# Altium footprint library LimeMicroAltiumLib_pcbLib_r01.PcbLib: 434 footprints (part 21 of 29)
Each footprint in its own frame and in the unit in brackets; x right, y up, seen from the top. Pads: shape width x height; smd on the part's side, far side on the other; paste and mask are expansions set on the pad; w line width, h text height; cw(c..) or ccw(c..) is an arc to the next point about the centre after c.
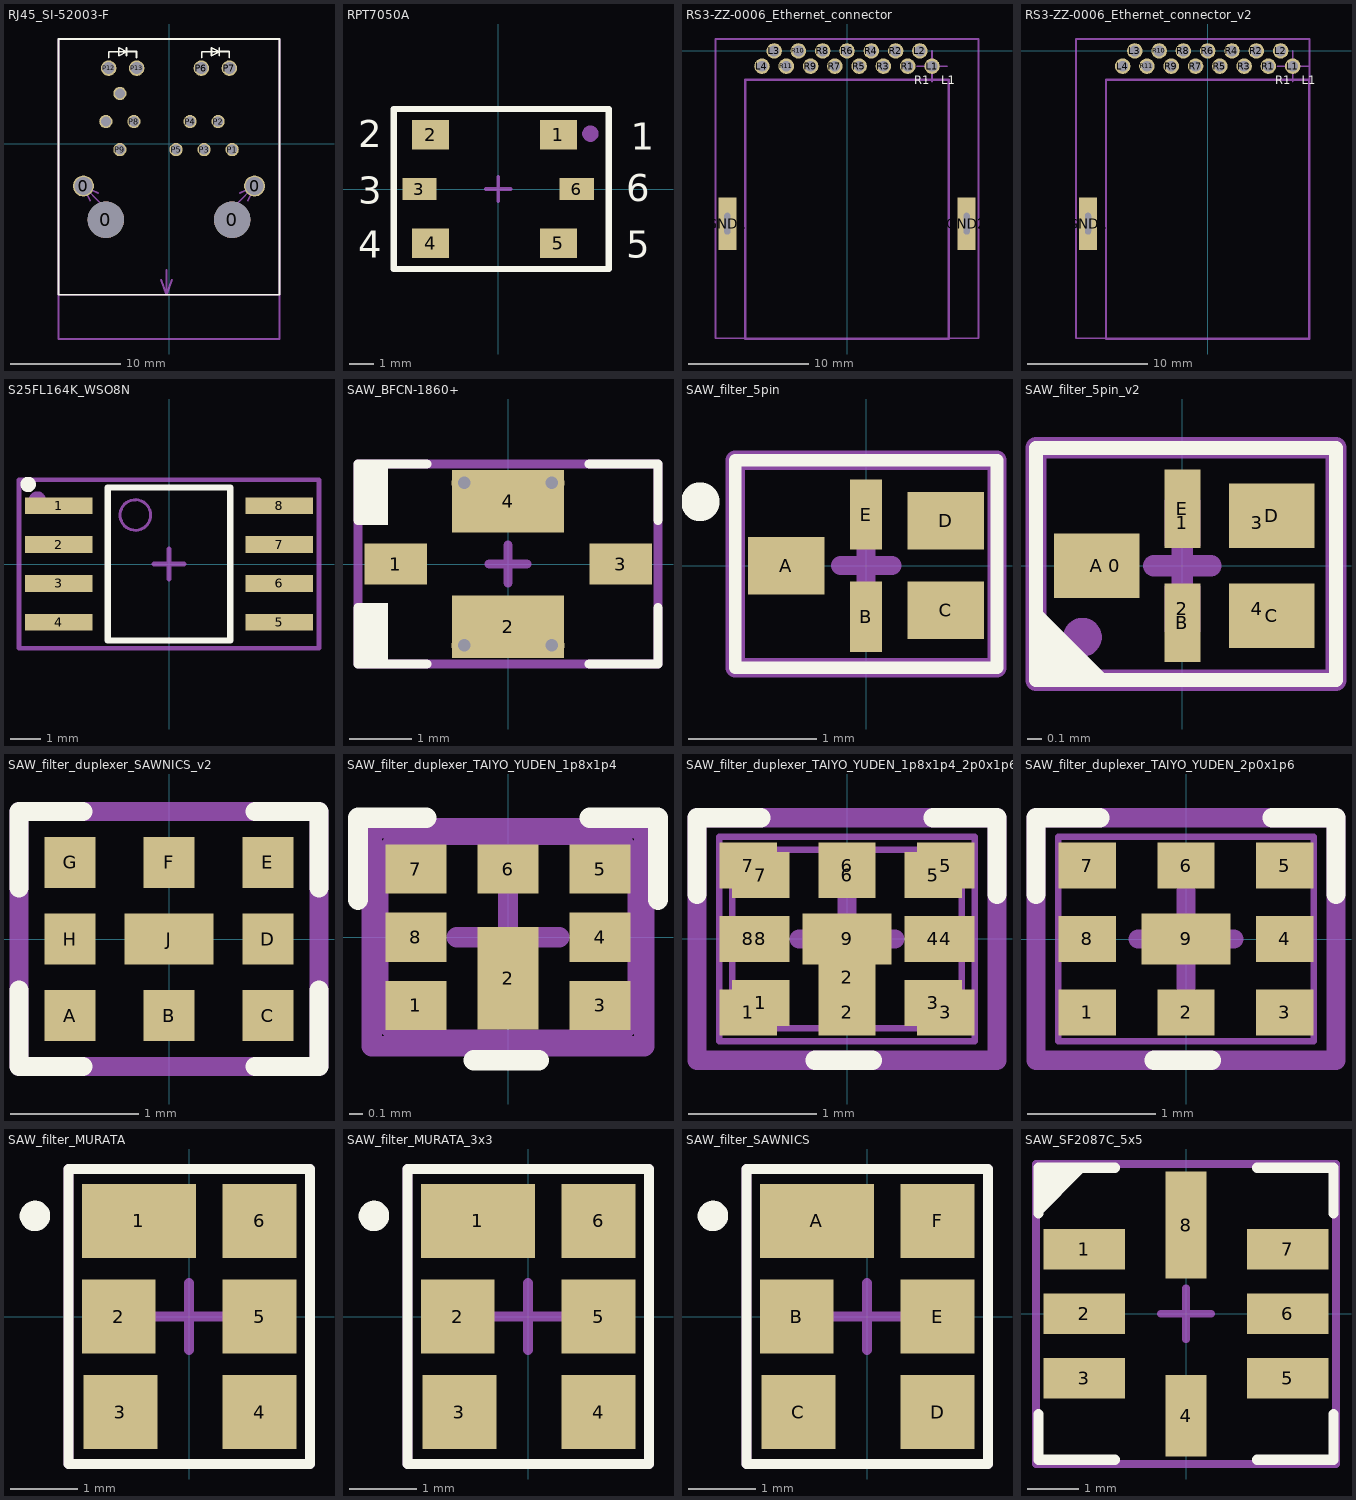
[diagram p20: the footprints below, top view; thin cyan lines are the x and y axes]

## RJ45_SI-52003-F [mm]
pads (17):
  round 1.9 hole 1.6 mask+0.05: 0(-7.745,-3.81) 0(7.745,-3.81)
  round 3.3 hole 3.3 unplated mask+0.05: 0(-5.715,-6.86) 0(5.715,-6.86)
  round 1.2 hole 0.9 mask+0.05: P1(5.715,-0.51) P2(4.445,2.03) P3(3.175,-0.51) P4(1.905,2.03) P5(0.635,-0.51) P8(-3.175,2.03) P9(-4.445,-0.51) P10(-5.715,2.03) P11(-4.445,4.57)
  round 1.4 hole 1.1 mask+0.05: P6(2.925,6.86) P7(5.465,6.86) P12(-5.465,6.86) P13(-2.925,6.86)
Top Overlay:
  lines w0.15: -5.44,7.815 -5.44,8.34 -3.84,8.34 ; -3.84,7.99 -3.84,8.69 ; -3.84,8.365 -2.94,8.365 -2.94,7.815 ; 2.95,7.815 2.95,8.34 4.55,8.34 ; 4.55,7.99 4.55,8.69 ; 4.55,8.365 5.45,8.365 5.45,7.815 ; -3.84,8.34 -4.54,8.69 -4.54,7.99 -3.84,8.34 ; 4.55,8.34 3.85,7.99 3.85,8.69 4.55,8.34 ; -10,-13.66 -10,9.5 10,9.5 10,-13.66 -10,-13.66
Mechanical 15:
  lines w0.15: -10,-13.66 10,-13.66 ; -7.119,-5.143 -7.745,-3.81 ; -6.412,-4.436 -7.745,-3.81 ; -6.147,-5.408 -7.745,-3.81 ; -0.725,-12.275 -0.225,-13.66 ; -0.225,-11.4 -0.225,-13.66 ; 0.275,-12.275 -0.225,-13.66 ; 6.147,-5.408 7.745,-3.81 ; 6.412,-4.436 7.745,-3.81 ; 7.119,-5.143 7.745,-3.81 ; -10,-17.65 10,-17.65 10,9.5 -10,9.5 -10,-17.65
  text "Assembly Note: solder plated holes" at -8.9,-6.45 h0.55
  text ".Designator" at -0.05,-0.025 h0.55
  text "6 / (A)" at 2.225,5.925 h0.55
  text "7 / (C)" at 4.85,5.95 h0.55
  text "13 / (C)" at -3.625,5.95 h0.55
  text "12 / (A)" at -6.15,5.95 h0.55
  text "11" at -4.725,4.25 h0.55
  text "10" at -6.025,1.75 h0.55
  text "9" at -4.6,-0.8 h0.55
  text "8" at -3.3,1.75 h0.55
  text "5" at 0.525,-0.725 h0.55
  text "4" at 1.875,1.825 h0.55
  text "3" at 3.075,-0.775 h0.55
  text "2" at 4.375,1.75 h0.55
  text "1" at 5.625,-0.7 h0.55
  text "board edge" at -2.7,-11.05 h0.55
3D body: height 0, standoff -2.5, extent 6.951,-4.608 8.545,-3.011
3D body: height 0, standoff -2.5, extent -8.539,-4.608 -6.945,-3.011
3D body: height 0, standoff -2.5, extent 4.115,-8.457 7.315,-5.263
3D body: height 0, standoff -2.5, extent -7.315,-8.457 -4.115,-5.263
3D body: height 0, standoff -2.5, extent 5.318,-0.909 6.115,-0.111
3D body: height 0, standoff -2.5, extent 2.778,-0.909 3.575,-0.111
3D body: height 0, standoff -2.5, extent 0.238,-0.909 1.035,-0.111
3D body: height 0, standoff -2.5, extent -4.842,-0.909 -4.045,-0.111
3D body: height 0, standoff -2.5, extent -6.112,1.631 -5.315,2.429
3D body: height 0, standoff -2.5, extent -3.572,1.631 -2.775,2.429
3D body: height 0, standoff -2.5, extent 4.048,1.631 4.845,2.429
3D body: height 0, standoff -2.5, extent 1.508,1.631 2.305,2.429
3D body: height 0, standoff -2.5, extent -4.842,4.171 -4.045,4.969
3D body: height 0, standoff -2.5, extent 4.969,6.361 5.965,7.359
3D body: height 0, standoff -2.5, extent 2.429,6.361 3.425,7.359
3D body: height 0, standoff -2.5, extent -3.421,6.361 -2.425,7.359
3D body: height 0, standoff -2.5, extent -5.961,6.361 -4.965,7.359
3D body "ACC-M-RJE60-188-5X01-REVT1_v2.STEP": height 14.73, standoff -0.04, extent -9.105,-17.62 9.105,3.87
3D body: height 13.6, standoff 0, extent -8,3.025 8,7.7

## RPT7050A [mm] "Rakon's Pluto+ ASIC"
pads (6):
  rect 1.5x1.2 smd: 1(2.45,2.2) 2(-2.75,2.2) 4(-2.75,-2.2) 5(2.45,-2.2)
  rect 1.4x0.9 smd: 3(-3.2,0) 6(3.2,0)
Top Overlay:
  lines w0.254: -4.25,-3.25 4.5,-3.25 4.5,3.25 -4.25,3.25 -4.25,3 -4.25,-3.25
  text "1" at 5.4,1.6 h1.1
  text "5" at 5.2,-2.8 h1.1
  text "6" at 5.2,-0.5 h1.1
  text "4" at -5.7,-2.8 h1.1
  text "3" at -5.7,-0.6 h1.1
  text "2" at -5.7,1.7 h1.1
Mechanical 15:
  circle w0.35: c3.75,2.25 r0.158
  lines w0.15: -0.5,0 0.5,0 ; 0,-0.5 0,0.5 ; -4.25,-3.25 -4.25,3.25 4.5,3.25 4.5,-3.25 -4.25,-3.25
  text ".Designator" at 0,0 h0.55

## RS3-ZZ-0006_Ethernet_connector [mm]
pads (17):
  rect 1.5x4.4 hole 0.5 slot 1.8 at 90 deg mask+0.05: GND1(-10,-14.43) GND2(10,-14.43)
  round 1.3 hole 0.9 mask+0.05: L1(7.105,-1.27) L2(6.09,0) L3(-6.09,0) L4(-7.105,-1.27) R1(5.075,-1.27) R2(4.06,0) R3(3.045,-1.27) R4(2.03,0) R5(1.015,-1.27) R6(0,0) R7(-1.015,-1.27) R8(-2.03,0) R9(-3.045,-1.27) R10(-4.06,0) R11(-5.075,-1.27)
Top Overlay:
  text "R1" at 5.625,-2.775 h0.7
  text "L1" at 7.875,-2.775 h0.7
Mechanical 13:
  lines w0.2: -8.5,-24.07 -8.5,-2.4 8.5,-2.4 8.5,-24.07 -8.5,-24.07
Mechanical 15:
  lines w0.15: 5.835,-1.27 7.105,-1.27 ; 7.105,-2.54 7.105,-1.27 ; 7.105,0 7.105,-1.27 ; 8.375,-1.27 7.105,-1.27 ; -11,-24 11,-24 11,1 -11,1 -11,-24
  text "L1" at 7.875,-2.775 h0.7
  text "R1" at 4.5,-3 h0.7
  text "L4" at -9.5,-2.5 h0.7
  text "L3" at -8.5,0 h0.7
  text "L2" at 7.5,0 h0.7
  text ".Designator" at 0,-12.5 h0.7

## RS3-ZZ-0006_Ethernet_connector_v2 [mm]
pads (16):
  rect 1.5x4.4 hole 0.5 slot 1.8 at 90 deg mask+0.05: GND1(-10,-14.43)
  round 1.3 hole 0.9 mask+0.05: L1(7.105,-1.27) L2(6.09,0) L3(-6.09,0) L4(-7.105,-1.27) R1(5.075,-1.27) R2(4.06,0) R3(3.045,-1.27) R4(2.03,0) R5(1.015,-1.27) R6(0,0) R7(-1.015,-1.27) R8(-2.03,0) R9(-3.045,-1.27) R10(-4.06,0) R11(-5.075,-1.27)
Top Overlay:
  text "R1" at 5.625,-2.775 h0.7
  text "L1" at 7.875,-2.775 h0.7
Mechanical 13:
  lines w0.2: -8.5,-24.07 -8.5,-2.4 8.5,-2.4 8.5,-24.07 -8.5,-24.07
Mechanical 15:
  lines w0.15: 5.835,-1.27 7.105,-1.27 ; 7.105,-2.54 7.105,-1.27 ; 7.105,0 7.105,-1.27 ; 8.375,-1.27 7.105,-1.27 ; -11,-24 8.5,-24 8.5,1 -11,1 -11,-24
  text "L1" at 7.875,-2.775 h0.7
  text "R1" at 4.5,-3 h0.7
  text "L4" at -9.5,-2.5 h0.7
  text "L3" at -8.5,0 h0.7
  text "L2" at 7.5,0 h0.7
  text ".Designator" at 0,-12.5 h0.7

## S25FL164K_WSO8N [mm]
height 1.7
pads (8):
  rect 2.2x0.55 smd: 1(-3.6,1.905) 2(-3.6,0.635) 3(-3.6,-0.635) 4(-3.6,-1.905) 5(3.6,-1.905) 6(3.6,-0.635) 7(3.6,0.635) 8(3.6,1.905)
Top Overlay:
  circle w0.25: c-4.6,2.6 r0.125
  lines w0.2: -2,-2.5 2,-2.5 2,2.5 -2,2.5 -2,-2.5
Mechanical 13:
  circle w0.1: c-1.1,1.6 r0.5
  lines w0.1: -2,-2.5 2,-2.5 2,2.5 -2,2.5 -2,-2.5
Mechanical 15:
  circle w0.35: c-4.3,2.1 r0.1
  lines w0.15: -0.5,0 0.5,0 ; 0,-0.5 0,0.5 ; -4.9,-2.75 4.9,-2.75 4.9,2.75 -4.9,2.75 -4.9,-2.75
  text ".Designator" at 0,0 h0.55
3D body "User Library-SOIC8_Wide_5mmx5mm.step": height 1.75, standoff -0.01, extent -4.151,-2.73 3.95,2.73

## SAW_BFCN-1860+ [mm]
pads (4):
  rect 1x0.65 smd mask+0.05: 1(-1.8,0) 3(1.8,0)
  rect 1.8x1 smd mask+0.05: 2(0,-1) 4(0,1)
via -0.7,-1.3 diameter 0.4 hole 0.2
via 0.7,-1.3 diameter 0.4 hole 0.2
via 0.7,1.3 diameter 0.4 hole 0.2
via -0.7,1.3 diameter 0.4 hole 0.2
Top Overlay:
  region: -2.4,-0.625 -1.925,-0.625 -1.925,-1.6 -2.4,-1.6
  region: -2.4,0.625 -1.925,0.625 -1.925,1.6 -2.4,1.6
  lines w0.15: -2.4,-0.7 -2.4,-1.6 -1.3,-1.6 ; -2.4,0.7 -2.4,1.6 -1.3,1.6 ; 1.3,-1.6 2.4,-1.6 2.4,-0.7 ; 1.3,1.6 2.4,1.6 2.4,0.7
Mechanical 15:
  circle w0.25: c-1.8,0 r0.1
  lines w0.15: -0.3,0 0.3,0 ; 0,-0.3 0,0.3 ; -2.4,-1.6 2.4,-1.6 2.4,1.6 -2.4,1.6 -2.4,-1.6
  text ".Designator" at 0,0 h0.55
3D body: height 1, standoff 0, extent -1.6,-0.8 1.6,0.8

## SAW_filter_5pin [mm]
pads (5):
  rect 0.6x0.45 smd mask+0.05: A(-0.625,0) C(0.625,-0.35) D(0.625,0.35)
  rect 0.25x0.55 smd mask+0.05: B(0,-0.4) E(0,0.4)
Top Overlay:
  circle w0.254: c-1.3,0.5 r0.025
  lines w0.1: -1.025,-0.8 -1.025,0.825 1.025,0.825 1.025,-0.8 -1.025,-0.8
Mechanical 15:
  lines w0.15: -0.2,0 0.2,0 ; 0,-0.2 0,0.2 ; -1.025,-0.8 1.025,-0.8 1.025,0.825 -1.025,0.825 -1.025,-0.8
  text ".Designator" at 0.075,0 h0.55
3D body: height 0.4, standoff 0, extent -0.7,-0.55 0.7,0.55

## SAW_filter_5pin_v2 [mm]
pads (10):
  rect 0.25x0.325 on Mech13 mask+0.05: 0(-0.475,0) 1(0,0.3) 2(0,-0.3) 3(0.525,0.3) 4(0.525,-0.3)
  rect 0.6x0.45 smd mask+0.05: A(-0.6,0) C(0.625,-0.35) D(0.625,0.35)
  rect 0.25x0.55 smd mask+0.05: B(0,-0.4) E(0,0.4)
Top Overlay:
  region: -1.025,-0.275 -0.5,-0.8 -1.025,-0.8
  lines w0.1: -1.025,-0.8 1.075,-0.8 1.075,0.825 -1.025,0.825 -1.025,-0.8
Mechanical 15:
  circle w0.2: c-0.7,-0.5 r0.035
  lines w0.15: -0.2,0 0.2,0 ; 0,-0.2 0,0.2 ; -1.025,-0.8 -1.025,0.825 1.075,0.825 1.075,-0.8 -1.025,-0.8
  text ".Designator" at 0.075,0 h0.55
3D body: height 0.4, standoff 0, extent -0.7,-0.55 0.7,0.55

## SAW_filter_duplexer_SAWNICS_v2 [mm]
pads (9):
  rect 0.4x0.4 smd mask+0.05: A(-0.775,-0.6) B(0,-0.6) C(0.775,-0.6) D(0.775,0) E(0.775,0.6) F(0,0.6) G(-0.775,0.6) H(-0.775,0)
  rect 0.7x0.4 smd mask+0.05: J(0,0)
Top Overlay:
  lines w0.15: -1.175,-0.4 -1.175,-1 -0.675,-1 ; -1.175,0.4 -1.175,1 -0.675,1 ; 0.675,-1 1.175,-1 1.175,-0.4 ; 0.675,1 1.175,1 1.175,0.4
Mechanical 15:
  circle w0.2: c-0.75,-0.575 r0.035
  lines w0.15: -1.175,-1 -1.175,1 1.175,1 1.175,-1 -1.175,-1
  text ".Designator" at -0.025,0 h0.55
3D body: height 0.5, standoff 0, extent -1.025,-0.8 0.975,0.8

## SAW_filter_duplexer_TAIYO_YUDEN_1p8x1p4 [mm] "Duplexer Taiyo Yuden 1.8 mm x 1.4 mm size (ex. band 3 D6DA1G842K2C4)"
pads (8):
  rect 0.45x0.36 smd mask+0.05: 1(-0.675,-0.5) 3(0.675,-0.5) 4(0.675,0) 5(0.675,0.5) 6(0,0.5) 7(-0.675,0.5) 8(-0.675,0)
  rect 0.45x0.75 smd mask+0.05: 2(0,-0.3)
Top Overlay:
  lines w0.15: -1.1,0.275 -1.1,0.875 -0.6,0.875 ; -0.25,-0.9 0.225,-0.9 ; 0.6,0.875 1.1,0.875 1.1,0.275
Top Solder:
  region: 0.95,-0.725 0.95,0.725 0.4,0.725 0.4,-0.725
  region: -0.95,-0.725 -0.95,0.725 -0.4,0.725 -0.4,-0.725
Mechanical 13:
  region: -0.775,-0.575 -0.775,-0.345 -0.475,-0.345 -0.475,-0.575
  region: -0.775,0.345 -0.775,0.575 -0.475,0.575 -0.475,0.345
  region: -0.775,-0.115 -0.775,0.115 -0.475,0.115 -0.475,-0.115
  region: -0.15,0.345 -0.15,0.575 0.15,0.575 0.15,0.345
  region: 0.775,-0.115 0.775,0.115 0.475,0.115 0.475,-0.115
  region: 0.775,0.345 0.775,0.575 0.475,0.575 0.475,0.345
  region: 0.775,-0.575 0.775,-0.345 0.475,-0.345 0.475,-0.575
  region: -0.15,-0.575 -0.15,-0.005 0.15,-0.005 0.15,-0.575
  lines w0.05: -0.9,-0.7 -0.9,0.7 0.9,0.7 0.9,-0.7 -0.9,-0.7
  text "1" at -0.425,-0.55 h0.2
  text "3" at 0.3,-0.55 h0.2
  text "5" at 0.3,0.375 h0.2
  text "7" at -0.425,0.37 h0.2
Mechanical 15:
  circle w0.2: c-0.65,-0.5 r0.035
  lines w0.15: -0.375,0 0,0 ; 0,-0.375 0,0 ; 0,0.375 0,0 ; 0.375,0 0,0 ; -1,-0.8 1,-0.8 1,0.8 -1,0.8 -1,-0.8
  text ".Designator" at 0.075,0.075 h0.55
3D body: height 0.5, standoff 0, extent -0.9,-0.7 0.9,0.7

## SAW_filter_duplexer_TAIYO_YUDEN_1p8x1p4_2p0x1p6 [mm] "Duplexer Taiyo Yuden unified 1.8 mm x 1.4 mm size and 2 mm x 1.6 mm packages"
pads (17):
  rect 0.45x0.36 smd mask+0.05: 1(-0.775,-0.575) 1(-0.675,-0.5) 2(0,-0.575) 3(0.675,-0.5) 3(0.775,-0.575) 4(0.675,0) 4(0.775,0) 5(0.675,0.5) 5(0.775,0.575) 6(0,0.5) 6(0,0.575) 7(-0.775,0.575) 7(-0.675,0.5) 8(-0.775,0) 8(-0.675,0)
  rect 0.45x0.75 smd mask+0.05: 2(0,-0.3)
  rect 0.7x0.4 smd mask+0.05: 9(0,0)
Top Overlay:
  lines w0.15: -1.175,0.35 -1.175,0.95 -0.675,0.95 ; -0.25,-0.95 0.2,-0.95 ; 0.675,0.95 1.175,0.95 1.175,0.35
Top Solder:
  region: -1.05,-0.825 -1.05,0.825 1.05,0.825 1.05,-0.825
Mechanical 13:
  region: -0.925,-0.725 -0.925,-0.425 -0.625,-0.425 -0.625,-0.725
  region: -0.15,-0.725 -0.15,-0.425 0.15,-0.425 0.15,-0.725
  region: -0.925,-0.15 -0.925,0.15 -0.625,0.15 -0.625,-0.15
  region: 0.625,-0.725 0.625,-0.425 0.925,-0.425 0.925,-0.725
  region: 0.625,0.725 0.625,0.425 0.925,0.425 0.925,0.725
  region: -0.15,0.725 -0.15,0.425 0.15,0.425 0.15,0.725
  region: -0.925,0.725 -0.925,0.425 -0.625,0.425 -0.625,0.725
  region: -0.3,-0.15 -0.3,0.15 0.3,0.15 0.3,-0.15
  region: 0.625,-0.15 0.625,0.15 0.925,0.15 0.925,-0.15
  region: -0.775,-0.575 -0.775,-0.345 -0.475,-0.345 -0.475,-0.575
  region: -0.775,0.345 -0.775,0.575 -0.475,0.575 -0.475,0.345
  region: -0.775,-0.115 -0.775,0.115 -0.475,0.115 -0.475,-0.115
  region: -0.15,0.345 -0.15,0.575 0.15,0.575 0.15,0.345
  region: 0.775,-0.115 0.775,0.115 0.475,0.115 0.475,-0.115
  region: 0.775,0.345 0.775,0.575 0.475,0.575 0.475,0.345
  region: 0.775,-0.575 0.775,-0.345 0.475,-0.345 0.475,-0.575
  region: -0.15,-0.575 -0.15,-0.005 0.15,-0.005 0.15,-0.575
  lines w0.05: -1,-0.8 1,-0.8 1,0.8 -1,0.8 -1,-0.8 ; -0.9,-0.7 -0.9,0.7 0.9,0.7 0.9,-0.7 -0.9,-0.7
  text "7" at -0.55,0.475 h0.2
  text "5" at 0.4,0.475 h0.2
  text "3" at 0.4,-0.675 h0.2
  text "1" at -0.55,-0.675 h0.2
  text "1" at -0.425,-0.55 h0.2
  text "3" at 0.3,-0.55 h0.2
  text "5" at 0.3,0.375 h0.2
  text "7" at -0.425,0.37 h0.2
Mechanical 15:
  circle w0.2: c-0.8,-0.575 r0.035
  lines w0.15: -0.375,0 0,0 ; 0,-0.375 0,0 ; 0,0.375 0,0 ; 0.375,0 0,0 ; -1.175,-0.95 1.175,-0.95 1.175,0.95 -1.175,0.95 -1.175,-0.95
  text ".Designator" at 0,0 h0.55
3D body: height 0.55, standoff 0.5, extent -0.898,-0.699 -0.5,-0.3
3D body: height 0.5, standoff 0, extent -1,-0.8 1,0.8
3D body: height 0.5, standoff 0, extent -0.9,-0.7 0.9,0.7

## SAW_filter_duplexer_TAIYO_YUDEN_2p0x1p6 [mm] "Duplexer Taiyo Yuden 2 mm x 1.6 mm size (ex. band 2 D6PE1G960P3BP)"
pads (9):
  rect 0.45x0.36 smd mask+0.05: 1(-0.775,-0.575) 2(0,-0.575) 3(0.775,-0.575) 4(0.775,0) 5(0.775,0.575) 6(0,0.575) 7(-0.775,0.575) 8(-0.775,0)
  rect 0.7x0.4 smd mask+0.05: 9(0,0)
Top Overlay:
  lines w0.15: -1.175,0.35 -1.175,0.95 -0.675,0.95 ; -0.25,-0.95 0.2,-0.95 ; 0.675,0.95 1.175,0.95 1.175,0.35
Mechanical 13:
  region: -0.925,-0.725 -0.925,-0.425 -0.625,-0.425 -0.625,-0.725
  region: -0.15,-0.725 -0.15,-0.425 0.15,-0.425 0.15,-0.725
  region: -0.925,-0.15 -0.925,0.15 -0.625,0.15 -0.625,-0.15
  region: 0.625,-0.725 0.625,-0.425 0.925,-0.425 0.925,-0.725
  region: 0.625,0.725 0.625,0.425 0.925,0.425 0.925,0.725
  region: -0.15,0.725 -0.15,0.425 0.15,0.425 0.15,0.725
  region: -0.925,0.725 -0.925,0.425 -0.625,0.425 -0.625,0.725
  region: -0.3,-0.15 -0.3,0.15 0.3,0.15 0.3,-0.15
  region: 0.625,-0.15 0.625,0.15 0.925,0.15 0.925,-0.15
  lines w0.05: -1,-0.8 1,-0.8 1,0.8 -1,0.8 -1,-0.8
  text "7" at -0.55,0.475 h0.2
  text "5" at 0.4,0.475 h0.2
  text "3" at 0.4,-0.675 h0.2
  text "1" at -0.55,-0.675 h0.2
Mechanical 15:
  circle w0.2: c-0.8,-0.575 r0.035
  lines w0.15: -0.375,0 0,0 ; 0,-0.375 0,0 ; 0,0.375 0,0 ; 0.375,0 0,0 ; -1.175,-0.95 1.175,-0.95 1.175,0.95 -1.175,0.95 -1.175,-0.95
  text ".Designator" at 0,0 h0.55
3D body: height 0.5, standoff 0, extent -1,-0.8 1,0.8

## SAW_filter_MURATA [mm]
pads (6):
  rect 1.7x1.1 smd: 1(-0.75,1.425)
  rect 1.1x1.1 smd: 2(-1.05,0) 3(-1.025,-1.425) 4(1.05,-1.425) 5(1.05,0) 6(1.05,1.425)
Top Overlay:
  circle w0.254: c-2.3,1.5 r0.1
  lines w0.15: -1.8,-2.2 -1.8,2.2 1.8,2.2 1.8,-2.2 -1.8,-2.2
Mechanical 15:
  circle w0.254: c-0.8,1.5 r0.1
  lines w0.15: -0.5,0 0,0 ; 0,-0.5 0,0 ; 0,0.5 0,0 ; 0.5,0 0,0 ; -1.8,-2.2 1.8,-2.2 1.8,2.2 -1.8,2.2 -1.8,-2.2
  text ".Designator" at 0,0 h0.55
3D body "SW3dPS-DCC6C.STEP": height 1.14, standoff -0.09, extent -1.475,-1.475 1.525,1.525

## SAW_filter_MURATA_3x3 [mm]
pads (6):
  rect 1.7x1.1 smd: 1(-0.75,1.425)
  rect 1.1x1.1 smd: 2(-1.05,0) 3(-1.025,-1.425) 4(1.05,-1.425) 5(1.05,0) 6(1.05,1.425)
Top Overlay:
  circle w0.254: c-2.3,1.5 r0.1
  lines w0.15: -1.8,-2.2 1.8,-2.2 1.8,2.2 -1.8,2.2 -1.8,-2.2
Mechanical 15:
  circle w0.254: c-0.8,1.5 r0.1
  lines w0.15: -0.5,0 0,0 ; 0,-0.5 0,0 ; 0,0.5 0,0 ; 0.5,0 0,0 ; -1.8,-2.2 -1.8,2.2 1.8,2.2 1.8,-2.2 -1.8,-2.2
  text ".Designator" at 0,0 h0.55
3D body "SW3dPS-DCC6C.STEP": height 1.14, standoff -0.09, extent -1.475,-1.475 1.525,1.525

## SAW_filter_SAWNICS [mm]
pads (6):
  rect 1.7x1.1 smd: A(-0.75,1.425)
  rect 1.1x1.1 smd: B(-1.05,0) C(-1.025,-1.425) D(1.05,-1.425) E(1.05,0) F(1.05,1.425)
Top Overlay:
  circle w0.254: c-2.3,1.5 r0.1
  lines w0.15: -1.8,-2.2 1.8,-2.2 1.8,2.2 -1.8,2.2 -1.8,-2.2
Mechanical 15:
  circle w0.254: c-0.8,1.5 r0.1
  lines w0.15: -0.5,0 0,0 ; 0,-0.5 0,0 ; 0,0.5 0,0 ; 0.5,0 0,0 ; -1.8,-2.2 -1.8,2.2 1.8,2.2 1.8,-2.2 -1.8,-2.2
  text ".Designator" at 0,0 h0.55
3D body "SW3dPS-DCC6C.STEP": height 1.14, standoff -0.09, extent -1.475,-1.475 1.525,1.525

## SAW_SF2087C_5x5 [mm]
pads (8):
  rect 1.6x0.8 smd mask+0.05: 1(-2,1.27) 2(-2,0) 3(-2,-1.27) 5(2,-1.27) 6(2,0) 7(2,1.27)
  rect 0.8x1.6 smd mask+0.05: 4(0,-2.005)
  rect 0.8x2.1 smd mask+0.05: 8(0,1.745)
Top Overlay:
  region: -2.9,1.9 -2,2.8 -2,2.9 -2.87,2.9 -2.9,2.87
  lines w0.2: -2.9,-1.97 -2.9,-2.87 -1.4,-2.87 ; -2.9,1.97 -2.9,2.87 -1.4,2.87 ; 1.4,-2.87 2.9,-2.87 2.9,-1.97 ; 1.4,2.87 2.9,2.87 2.9,1.97
Mechanical 15:
  circle w0.25: c-2,1.3 r0.1
  lines w0.15: -0.5,0 0.5,0 ; 0,-0.5 0,0.5 ; -2.95,-2.955 -2.95,2.945 2.95,2.945 2.95,-2.955 -2.95,-2.955
  text ".Designator" at 0,0 h0.55
3D body "User Library-TA0731.step": height 1.7, standoff 0, extent -2.5,-2.5 2.5,2.5